# Altium footprint library DrPCB.PcbLib: 910 footprints (part 25 of 57)
Each footprint in its own frame and in the unit in brackets; x right, y up, seen from the top. Pads: shape width x height; smd on the part's side, far side on the other; paste and mask are expansions set on the pad; w line width, h text height; cw(c..) or ccw(c..) is an arc to the next point about the centre after c.
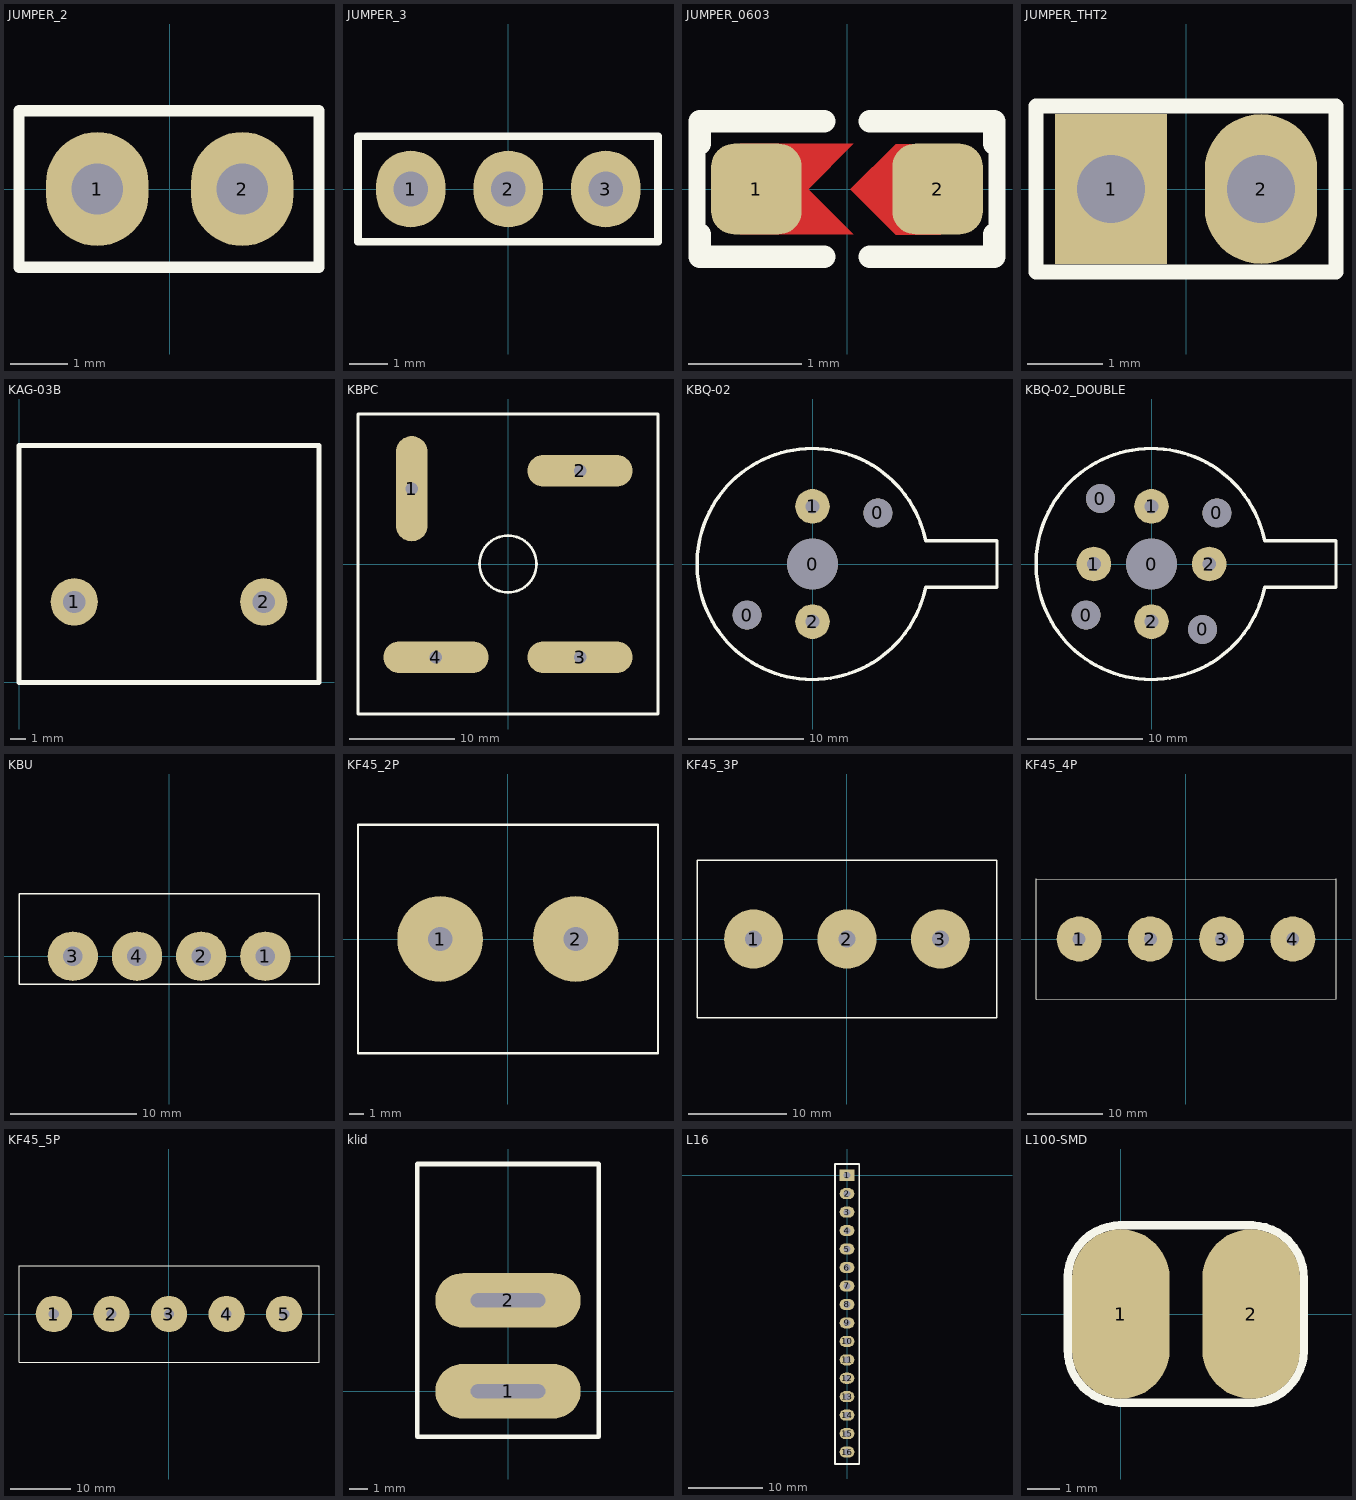
[diagram p24: the footprints below, top view; thin cyan lines are the x and y axes]

## JUMPER_2 [mm]
pads (2):
  oval 1.8x2 hole 0.9: 1(-1.27,0) 2(1.27,0)
Top Overlay:
  lines w0.2: -2.642,-1.372 2.616,-1.372 2.616,1.372 -2.642,1.372 -2.642,-1.372
3D body "User Library-Jumper SL2.STEP": height 9.5, standoff -2.6, extent -2.513,-1.27 2.487,1.27

## JUMPER_3 [mm]
pads (3):
  oval 1.8x2 hole 0.9: 1(-2.54,0) 2(0,0) 3(2.54,0)
Top Overlay:
  lines w0.2: -3.912,-1.372 3.899,-1.372 3.899,1.372 -3.912,1.372 -3.912,-1.372
3D body "pin header 1x3 and jumper.stp": height 9, standoff -2.99, extent -3.81,-1.27 3.81,1.27

## JUMPER_0603 [mm] "CHIP Resistor 1/10 WATT, 1.6x0.8mm, 0603, 1608"
height 0.6
pads (2):
  rrect50% 0.8x0.8 smd paste-3 mask+0.05: 1(-0.8,0) 2(0.8,0)
Top Layer:
  region: 0.429,0.397 0.029,-0.003 0.429,-0.403 0.829,-0.403 0.829,0.397
  region: -0.943,0.4 0.057,0.4 -0.343,0 0.057,-0.4 -0.943,-0.4
Top Overlay:
  lines w0.15: -1.325,-0.4 -1.325,0.4 ; 1.325,-0.4 1.325,0.4
  lines w0.2: -1.3,-0.4 -1.3,-0.6 -0.2,-0.6 ; -1.3,0.4 -1.3,0.6 -0.2,0.6 ; 0.2,-0.6 1.3,-0.6 1.3,-0.4 ; 0.2,0.6 1.3,0.6 1.3,0.4
Top Solder:
  region: -0.9,-0.5 -0.9,0.5 0.9,0.5 0.9,-0.5
3D body "User Library-RES_1609-0603.step": height 0.56, standoff 0, extent -0.85,-0.4 0.85,0.4

## JUMPER_THT2 [mm]
pads (2):
  rect 1.5x2 hole 0.9: 1(-1,0)
  oval 1.5x2 hole 0.9: 2(1,0)
Top Overlay:
  lines w0.2: -2,1.105 -2,-1.105 1.968,-1.105 ; -1.981,1.105 2,1.105 2,-1.105

## KAG-03B [mm]
pads (2):
  round 3 hole 1.4: 1(3.5,5.1) 2(15.5,5.1)
Top Overlay:
  lines w0.3: 0,0 0,15 19,15 19,0 0,0

## KBPC [mm]
pads (4):
  oval 3x10 hole 1.2: 1(-9.15,7.15)
  oval 10x3 hole 1.2: 2(6.85,8.85) 3(6.85,-8.85) 4(-6.85,-8.85)
Top Overlay:
  circle w0.254: c0,0 r2.7
  lines w0.254: -14.25,-14.25 -14.25,14.25 14.25,14.25 14.25,-14.25 -14.25,-14.25

## KBQ-02 [mm]
pads (5):
  round 2.5 hole 2.5: 0(-5.67,-4.43) 0(5.67,4.43)
  round 4.4 hole 4.4: 0(0,0)
  round 3 hole 1.2: 1(0,5) 2(0,-5)
Top Overlay:
  lines w0.3: 9.817,-2.001 cw(c0,0) 9.817,2 16,2 16,-2 9.817,-2
3D body: height 10, standoff 0, extent -10,-10 10,10
3D body: height 4, standoff 0, extent 9.01,-2 16.01,2
3D body: height 13, standoff 10, extent -7,-7 7,7

## KBQ-02_DOUBLE [mm]
pads (9):
  round 2.5 hole 2.5: 0(-5.67,-4.43) 0(-4.43,5.67) 0(4.43,-5.67) 0(5.67,4.43)
  round 4.4 hole 4.4: 0(0,0)
  round 3 hole 1.2: 1(-5,0) 1(0,5) 2(0,-5) 2(5,0)
Top Overlay:
  lines w0.3: 9.817,-2.001 cw(c0,0) 9.817,2 16,2 16,-2 9.817,-2
3D body: height 10, standoff 0, extent -10,-10 10,10
3D body: height 4, standoff 0, extent 9.01,-2 16.01,2
3D body: height 13, standoff 10, extent -7,-7 7,7

## KBU [mm]
pads (4):
  oval 4x3.9 hole 1.55: 1(7.65,0) 2(2.55,0) 3(-7.65,0) 4(-2.55,0)
Top Overlay:
  lines w0.1: -11.925,-2.235 11.913,-2.235 11.913,4.978 -11.925,4.978 -11.925,-2.235
3D body "User Library-KBU1010.step": height 19.34, standoff -28.36, extent -11.857,-2.182 11.857,4.919

## KF45_2P [mm]
pads (2):
  round 6 hole 1.7: 1(-4.75,0) 2(4.75,0)
Top Overlay:
  lines w0.15: -10.5,-8 10.5,-8 10.5,8 -10.5,8 -10.5,-8
3D body "DG45C-B-02P-13.stp": height 18.4, standoff -5.2, extent -10.45,-8.15 10.45,8.15

## KF45_3P [mm]
pads (3):
  round 6 hole 1.7: 1(-9.5,0) 2(0,0) 3(9.5,0)
Top Overlay:
  lines w0.15: -15.25,-8 -15.25,8 15.25,8 15.25,-8 -15.25,-8
3D body "DG45C-B-03P-13.stp": height 18.4, standoff -5.2, extent -15.2,-8.15 15.2,8.15

## KF45_4P [mm]
pads (4):
  round 6 hole 1.7: 1(-14.25,0) 2(-4.75,0) 3(4.75,0) 4(14.25,0)
Top Overlay:
  lines w0.15: -20,-8 20,-8 20,8 -20,8 -20,-8
3D body "DG45C-B-04P-13.stp": height 18.4, standoff -5.2, extent -19.95,-8.15 19.95,8.15

## KF45_5P [mm]
pads (5):
  round 6 hole 1.7: 1(-19,0) 2(-9.5,0) 3(0,0) 4(9.5,0) 5(19,0)
Top Overlay:
  lines w0.15: -24.75,-8 24.75,-8 24.75,8 -24.75,8 -24.75,-8
3D body "DG45C-B-05P-13.stp": height 18.4, standoff -5.2, extent -24.7,-8.15 24.7,8.15

## klid [mm]
pads (2):
  oval 8x3 hole 0.762 slot 4.1 at 0 deg: 1(0,0) 2(0,5)
Top Overlay:
  lines w0.254: 5,12.453 5,-2.5 -5,-2.5 -5,12.5 5,12.5

## L16 [mm]
pads (16):
  rect 2x1.5 / inner rect 2x1.6 / far side rect 2x1.5 hole 0.9: 1(0,0)
  oval 2x1.5 / inner oval 2x1.6 / far side oval 2x1.5 hole 0.9: 2(0,-2.5) 3(0,-5) 4(0,-7.5) 5(0,-10) 6(0,-12.5) 7(0,-15) 8(0,-17.5) 9(0,-20) 10(0,-22.5) 11(0,-25) 12(0,-27.5) 13(0,-30) 14(0,-32.5) 15(0,-35) 16(0,-37.5)
Top Overlay:
  lines w0.254: -1.651,-39.116 1.651,-39.116 1.651,1.524 -1.651,1.524 -1.651,-39.116

## L100-SMD [mm]
pads (2):
  oval 3x5.2 smd: 1(0,0) 2(4,0)
Top Overlay:
  lines w0.254: -1.626,-1.092 -1.626,1.194 ; -1.626,-1.079 ccw(c-0.013,-1.105) -0.038,-2.718 ; -1.626,1.13 cw(c-0.013,1.105) 0.013,2.718 ; -0.051,2.718 4.039,2.718 ; -0.025,-2.718 4.064,-2.718 ; 3.975,-2.718 ccw(c4,-1.105) 5.613,-1.13 ; 4.026,2.718 cw(c4,1.105) 5.613,1.079 ; 5.613,-1.092 5.613,1.067